# Altium schematic symbol library JL_SCH.SchLib: 1185 symbols (part 5 of 6)
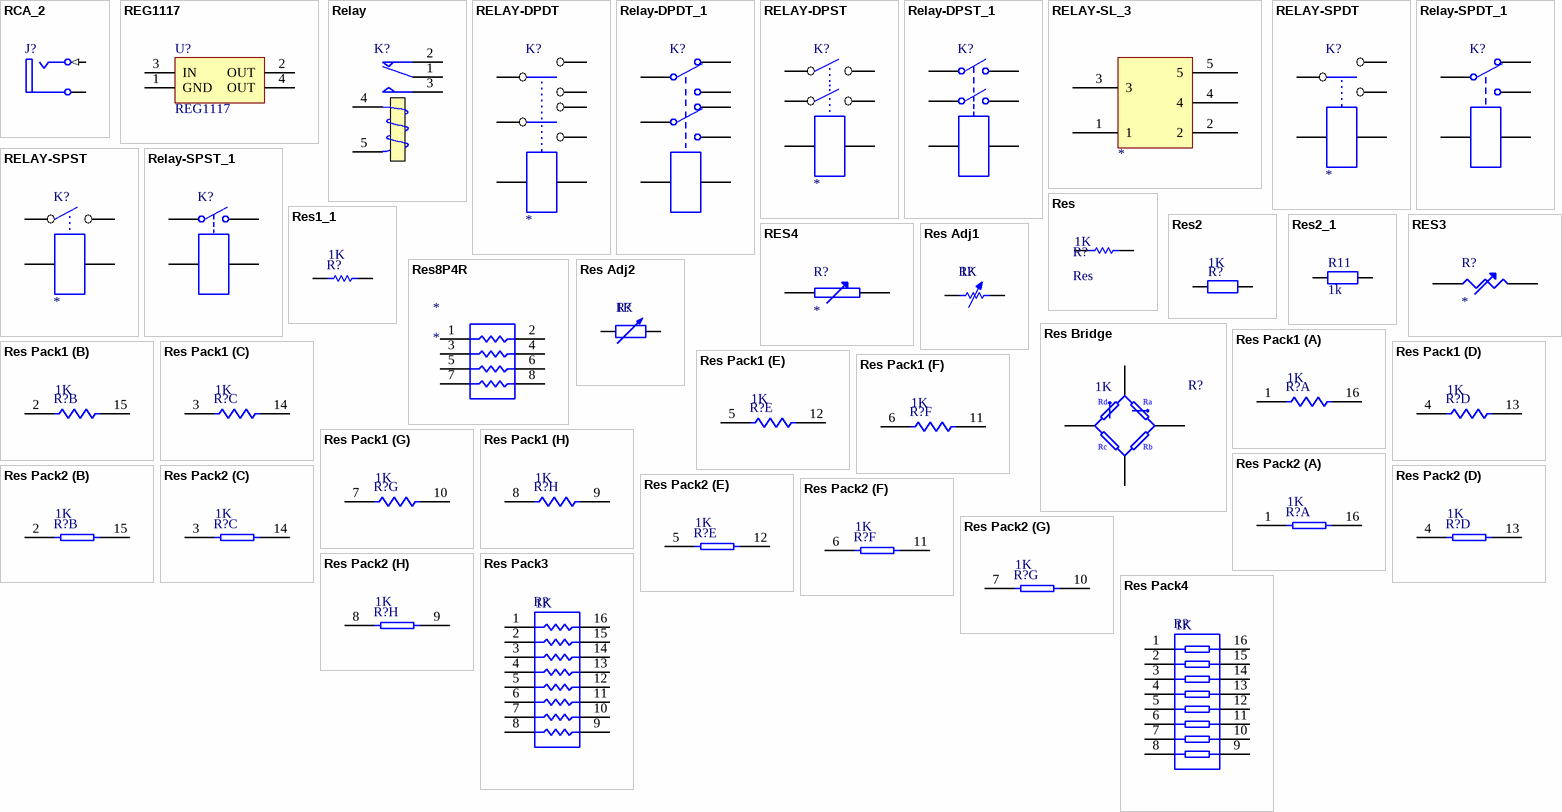
[diagram p42: symbols RCA_2 to Res Pack4]

## Res
designator R?  value 1K
贴片电阻; Published: 8-Jun-2000; LatestRevisionDate: 17-Jul-2002; LatestRevisionNote: Re-released for DXP Platform.; PackageReference: AXIAL-0.3; Publisher: Altium Limited
footprint R2012 (Chip Resistor, 2-Leads, Body 2.0x1.2mm, IPC Low Density)
pins: 1, 2

## Res1_1
designator R?  value 1K
Resistor; Published: 8-Jun-2000; LatestRevisionDate: 17-Jul-2002; LatestRevisionNote: Re-released for DXP Platform.; PackageReference: AXIAL-0.3; Publisher: Altium Limited
footprint AXIAL-0.3 (Axial Device, Thru-Hole; 2 Leads; 0.3 in Pin Spacing)
simulation model RESISTOR (Resistor)
signal-integrity model Res
pins: 1, 2

## Res2
designator R?, comment 1K
Resistor; Published: 8-Jun-2000; LatestRevisionDate: 17-Jul-2002; LatestRevisionNote: Re-released for DXP Platform.; PackageReference: AXIAL-0.4; Publisher: Altium Limited; Value: 1K
footprint 0805R
simulation model RESISTOR (Resistor)
signal-integrity model Res
3D model R0805 (PCB3D Model)
footprint 0603R
footprint 1206R
pins: 1, 2

## Res2_1
designator R11, comment 1k
Resistor; Published: 8-Jun-2000; LatestRevisionDate: 17-Jul-2002; LatestRevisionNote: Re-released for DXP Platform.; PackageReference: AXIAL-0.4; Publisher: Altium Limited; Value: 1k
footprint 0603 (Chip Inductor; Body 1.6 x 0.8 mm (LxW typ))
simulation model RESISTOR (Resistor)
signal-integrity model Res
pins: 1, 2

## RES3
designator R?
pins: 1, 2

## RES4
designator R?
pins: 1, 2

## Res8P4R
designator *
footprint 8P4R-B-SMD
pins: 1, 2, 3, 4, 5, 6, 7, 8

## Res Adj1
designator R?  value 1K
Variable Resistor; Set Position: 0.5; Published: 8-Jun-2000; LatestRevisionDate: 17-Jul-2002; LatestRevisionNote: Re-released for DXP Platform.; PackageReference: AXIAL-0.7; Publisher: Altium Limited
footprint AXIAL-0.7 (Axial Device, Thru-Hole; 2 Leads; 0.7 in Pin Spacing)
simulation model VRES (Variable Resistor)
signal-integrity model Res Adj
pins: 1, 2

## Res Adj2
designator R?  value 1K
Variable Resistor; Set Position: 0.5; Published: 8-Jun-2000; LatestRevisionDate: 17-Jul-2002; LatestRevisionNote: Re-released for DXP Platform.; PackageReference: AXIAL-0.6; Publisher: Altium Limited
footprint AXIAL-0.6 (Axial Device, Thru-Hole; 2 Leads; 0.6 in Pin Spacing)
simulation model VRES (Variable Resistor)
signal-integrity model Res Adj
pins: 1, 2

## Res Bridge
designator R?  value 1K
Resistor Bridge; Published: 24-Mar-1999; LatestRevisionDate: 17-Jul-2002; LatestRevisionNote: Re-released for DXP Platform.; PackageReference: P04A; Publisher: Altium Limited
footprint SFM-T4/A4.1V (TO, Thru-Hole, Vertical, Heatsink Mounted; 4 In-Line Leads; Pitch 2.54 mm)
signal-integrity model Res Bridge
pins: 1, 2, 3, 4
text: Rd; Ra; Rc; Rb

## Res Pack1
designator R?  value 1K
Isolated Resistor Network - Parts; Sim Note: Enter the Resistance value into parameter field.; Published: 24-Mar-1999; LatestRevisionDate: 29-May-2009; LatestRevisionNote: IPC-7351 Footprint Added.; PackageReference: SOIC16; Publisher: Altium Limited; PackageDescription: 16-Pin Small Outline Integrated Circuit 1.27 mm Pitch; Code_JEDEC: MS-012-AC; Code_IPC: SOIC127P600-16
footprint SOIC127P600-16N (SOIC, 16-Leads, Body 9.9x3.9mm, Pitch 1.27mm, IPC Medium Density)
footprint SOIC127P600-16L (SOIC, 16-Leads, Body 9.9x3.9mm, Pitch 1.27mm, IPC High Density)
footprint SOIC127P600-16M (SOIC, 16-Leads, Body 9.9x3.9mm, Pitch 1.27mm, IPC Low Density)
simulation model RESISTOR (Resistor)
signal-integrity model Res Pack
part A pins: 1, 16
part B pins: 2, 15
part C pins: 3, 14
part D pins: 4, 13
part E pins: 5, 12
part F pins: 6, 11
part G pins: 7, 10
part H pins: 8, 9

## Res Pack2
designator R?  value 1K
Isolated Resistor Network - Parts; Sim Note: Enter the Resistance value into parameter field.; Published: 24-Mar-1999; LatestRevisionDate: 17-Jul-2002; LatestRevisionNote: Re-released for DXP Platform.; PackageReference: DIP-16; Publisher: Altium Limited; Code_JEDEC: MO-001-AC
footprint DIP-16 (DIP; 16 Leads; Row Spacing 7.62 mm; Pitch 2.54 mm)
simulation model RESISTOR (Resistor)
signal-integrity model Res Pack
part A pins: 1, 16
part B pins: 2, 15
part C pins: 3, 14
part D pins: 4, 13
part E pins: 5, 12
part F pins: 6, 11
part G pins: 7, 10
part H pins: 8, 9

## Res Pack3
designator R?  value 1K
Isolated Resistor Network; Published: 24-Mar-1999; LatestRevisionDate: 29-May-2009; LatestRevisionNote: IPC-7351 Footprint Added.; PackageReference: SO-16; Publisher: Altium Limited; PackageDescription: 16-Pin Small Outline Integrated Circuit 1.27 mm Pitch; Code_JEDEC: MS-012-AC; Code_IPC: SOIC127P600-16
footprint SOIC127P600-16N (SOIC, 16-Leads, Body 9.9x3.9mm, Pitch 1.27mm, IPC Medium Density)
footprint SOIC127P600-16L (SOIC, 16-Leads, Body 9.9x3.9mm, Pitch 1.27mm, IPC High Density)
footprint SOIC127P600-16M (SOIC, 16-Leads, Body 9.9x3.9mm, Pitch 1.27mm, IPC Low Density)
simulation model respack_8 (Spice Subcircuit)
pins: 1, 2, 3, 4, 5, 6, 7, 8, 9, 10, 11, 12, 13, 14, 15, 16

## Res Pack4
designator R?  value 1K
Isolated Resistor Network; Published: 24-Mar-1999; LatestRevisionDate: 29-May-2009; LatestRevisionNote: IPC-7351 Footprint Added.; PackageVersion: Oct-2003; PackageReference: SSOP16; Publisher: Altium Limited; PackageDescription: 16-Pin Plastic Small Outline Package 0.65 mm Pitch; Code_JEDEC: MO-150-AC; Code_IPC: SOP65P780-16
footprint SOP65P780-16N (SOP, 16-Leads, Body 6.2x5.3mm, Pitch 0.65mm, IPC Medium Density)
footprint SOP65P780-16L (SOP, 16-Leads, Body 6.2x5.3mm, Pitch 0.65mm, IPC High Density)
footprint SOP65P780-16M (SOP, 16-Leads, Body 6.2x5.3mm, Pitch 0.65mm, IPC Low Density)
simulation model respack_8 (Spice Subcircuit)
pins: 1, 2, 3, 4, 5, 6, 7, 8, 9, 10, 11, 12, 13, 14, 15, 16

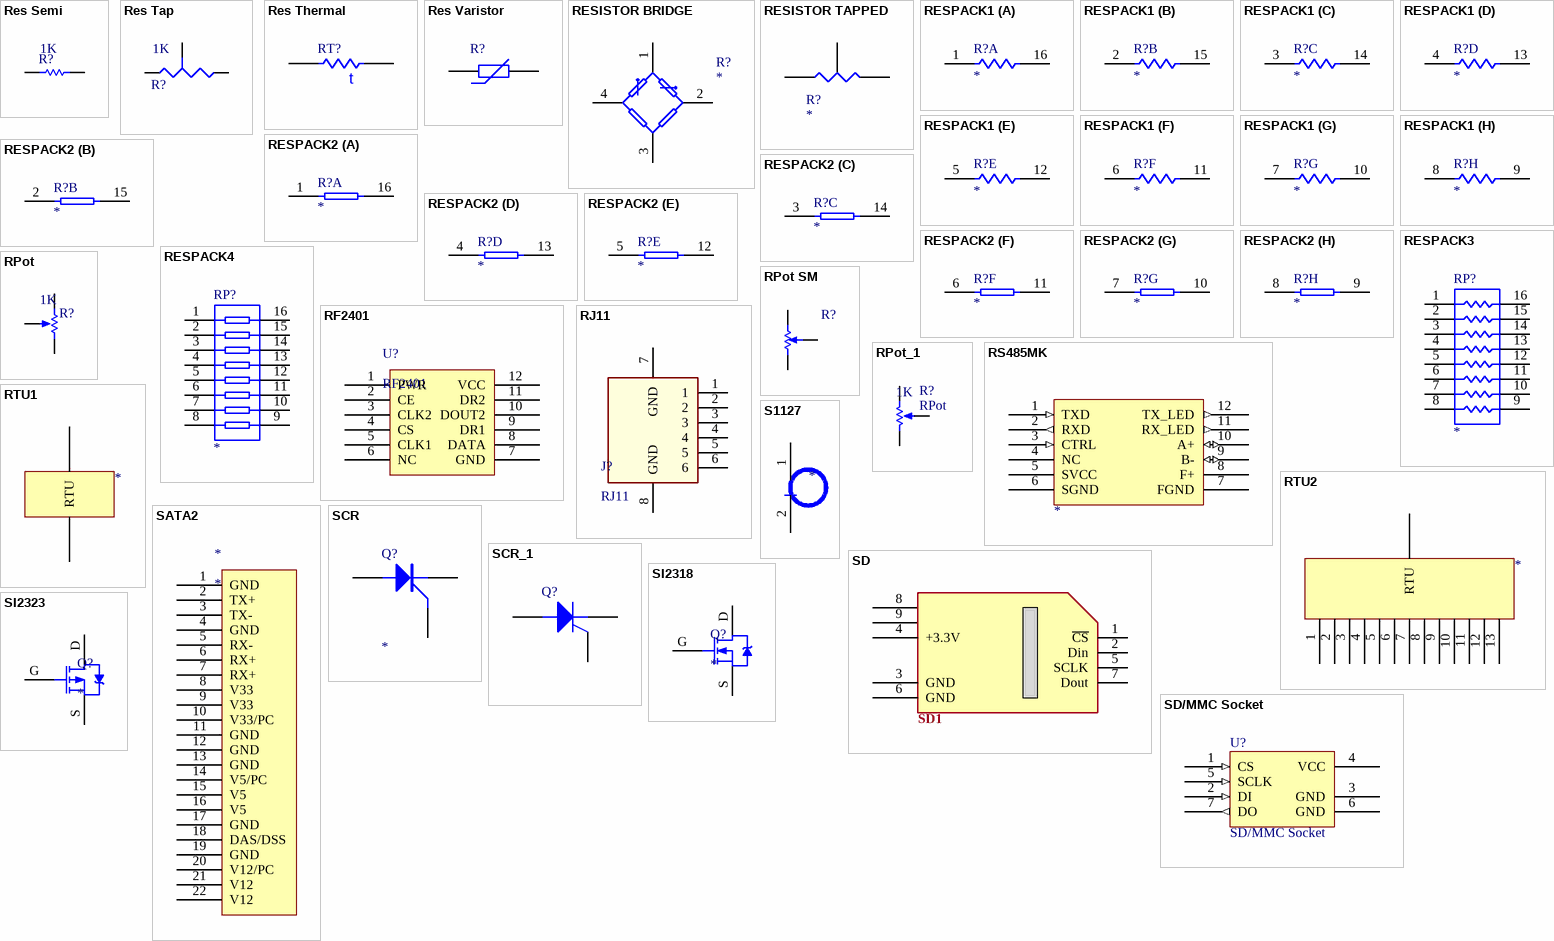
[diagram p28: symbols Res Semi to SI2323]

## Res Semi
designator R?  value 1K
Semiconductor Resistor; Published: 8-Jun-2000; LatestRevisionDate: 17-Jul-2002; LatestRevisionNote: Re-released for DXP Platform.; PackageReference: AXIAL-0.5; Publisher: Altium Limited
footprint AXIAL-0.5 (Axial Device, Thru-Hole; 2 Leads; 0.5 in Pin Spacing)
footprint RESC1005L (Chip Resistor, Body 1.1x0.5mm, IPC High Density)
footprint RESC1608L (Chip Resistor, Body 1.6x0.8mm, IPC High Density)
footprint RESC2012L (Chip Resistor, Body 2.0x1.3mm, IPC High Density)
footprint RESC3216L (Chip Resistor, Body 3.1x1.6mm, IPC High Density)
simulation model RES (Semiconductor Resistor)
signal-integrity model Res Semi
pins: 1, 2

## Res Tap
designator R?  value 1K
Tapped Resistor; Sim Note: Enter the Resistance value and the set point into parameter fields.; Set Position: 0.5; Published: 24-Mar-1999; LatestRevisionDate: 17-Jul-2002; LatestRevisionNote: Re-released for DXP Platform.; PackageReference: VR3; Publisher: Altium Limited
footprint VR3 (Variable Resistor, Thru-Hole; 3 Leads)
simulation model POT (Potentiometer)
signal-integrity model Res Tap
pins: 1 A, 2 B, 3 TAP

## Res Thermal
designator RT?
Thermistor; Published: 24-Mar-1999; LatestRevisionDate: 29-May-2009; LatestRevisionNote: IPC-7351 Footprint Added.; PackageVersion: Mar-2003; PackageReference: 6-0805; Publisher: Altium Limited; PackageDescription: Chip Resistor 0805 Case Size; Code_IPC: RESC2012
footprint RESC2012N (Chip Resistor, Body 2.0x1.2mm, IPC Medium Density)
footprint RESC2012L (Chip Resistor, Body 2.0x1.2mm, IPC High Density)
footprint RESC2012M (Chip Resistor, Body 2.0x1.2mm, IPC Low Density)
pins: 1, 2
text: t

## Res Varistor
designator R?
Varistor (Voltage-Sensitive Resistor); Published: 24-Mar-1999; LatestRevisionDate: 29-May-2009; LatestRevisionNote: IPC-7351 Footprint Added.; PackageVersion: Mar-2003; PackageReference: 6-0805; Publisher: Altium Limited; PackageDescription: Chip Resistor 0805 Case Size; Code_IPC: RESC2012
footprint RESC2012N (Chip Resistor, Body 2.0x1.2mm, IPC Medium Density)
footprint RESC2012L (Chip Resistor, Body 2.0x1.2mm, IPC High Density)
footprint RESC2012M (Chip Resistor, Body 2.0x1.2mm, IPC Low Density)
pins: 1, 2

## RESISTOR BRIDGE
designator R?
Resistor Bridge
pins: 1, 2, 3, 4

## RESISTOR TAPPED
designator R?
pins: 1 A, 2 B, 3 TAP

## RESPACK1
designator R?
footprint DIP-16
part A pins: 1, 16
part B pins: 2, 15
part C pins: 3, 14
part D pins: 4, 13
part E pins: 5, 12
part F pins: 6, 11
part G pins: 7, 10
part H pins: 8, 9

## RESPACK2
designator R?
footprint DIP-16
part A pins: 1, 16
part B pins: 2, 15
part C pins: 3, 14
part D pins: 4, 13
part E pins: 5, 12
part F pins: 6, 11
part G pins: 7, 10
part H pins: 8, 9

## RESPACK3
designator RP?
footprint DIP-16
pins: 1, 2, 3, 4, 5, 6, 7, 8, 9, 10, 11, 12, 13, 14, 15, 16

## RESPACK4
designator RP?
footprint DIP-16
pins: 1, 2, 3, 4, 5, 6, 7, 8, 9, 10, 11, 12, 13, 14, 15, 16

## RF2401
designator U?
footprint RF2401
pins: 1 PWR, 2 CE, 3 CLK2, 4 CS, 5 CLK1, 6 NC, 7 GND, 8 DATA, 9 DR1, 10 DOUT2, 11 DR2, 12 VCC

## RJ11
designator J?
footprint RJ11 (Footprint not found)
pins: 1, 2, 3, 4, 5, 6, 7 GND, 8 GND, 9, 10

## RPot
designator R?  value 1K
Potentiometer; Sim Note: Enter the Resistance value and the set point into parameter fields.; Set Position: 0.5; Published: 8-Jun-2000; LatestRevisionDate: 17-Jul-2002; LatestRevisionNote: Re-released for DXP Platform.; PackageReference: VR5; Publisher: Altium Limited
footprint VR5 (Variable Resistor, Thru-Hole; 3 Leads)
simulation model POT (Potentiometer)
pins: 1 TOP, 2 BOT, 3 TAP
1 alternate drawing of the same symbol

## RPot SM
designator R?
Square Trimming Potentiometer; Published: 17-Dec-2003; DatasheetVersion: Oct-2003; PackageReference: POT4MM-2; Publisher: Altium Limited; ComponentLink1Description: Manufacturer Link; ComponentLink1URL: http://bourns.com/2/search.html
footprint POT4MM-2 (Square Trimming Potentiometer)
pins: CCW -, CW +, W
1 alternate drawing of the same symbol

## RPot_1
designator R?, comment RPot  value 1K
电位器; Sim Note: Enter the Resistance value and the set point into parameter fields.; Set Position: 0.5; Published: 8-Jun-2000; LatestRevisionDate: 17-Jul-2002; LatestRevisionNote: Re-released for DXP Platform.; PackageReference: VR5; Publisher: Altium Limited
footprint RP1
pins: 1 TOP, 2 BOT, 3 TAP
1 alternate drawing of the same symbol

## RS485MK
designator ?
pins: 1 TXD (in), 2 RXD (out), 3 CTRL (in), 4 NC, 5 SVCC (power), 6 SGND (power), 7 FGND (power), 8 F+ (power), 9 B- (io), 10 A+ (io), 11 RX_LED (out), 12 TX_LED (out)

## RTU1
designator ?
pins: ?1 RTU, ?2

## RTU2
designator ?
pins: 1, 2, 3, 4, 5, 6, 7, 8, 9, 10, 11, 12, 13, ?1 RTU

## S1127
designator ?
pins: 1 A, 2 K

## SATA2
designator *
pins: 1 GND, 2 TX+, 3 TX-, 4 GND, 5 RX-, 6 RX+, 7 RX+, 8 V33, 9 V33, 10 V33/PC, 11 GND, 12 GND, 13 GND, 14 V5/PC, 15 V5, 16 V5, 17 GND, 18 DAS/DSS, 19 GND, 20 V12/PC, 21 V12, 22 V12

## SCR
designator Q?
pins: 1 A, 2 K, 3 G

## SCR_1
designator Q?
Silicon Controlled Rectifier; Published: 8-Jun-2000; LatestRevisionDate: 17-Jul-2002; LatestRevisionNote: Re-released for DXP Platform.; PackageReference: TO-220-AB; Publisher: Altium Limited; Code_JEDEC: TO-220-AB
footprint SFM-T3/E10.7V (TO, Thru-Hole, Vertical, Heatsink Mounted; 3 In-Line Leads; Pitch 2.54 mm)
simulation model SCR (Spice Subcircuit)
pins: 1 A, 2 G, 3 K

## SD
designator SD1  (value not drawn)
footprint SD-A
pins: 1 ~{CS}, 2 Din, 3 GND, 4 +3.3V, 5 SCLK, 6 GND, 7 Dout, 8, 9

## SD/MMC Socket
designator U?
footprint SDPCB
pins: 1 CS (in) "Chip Select (neg true)", 2 DI (in) "Data In", 3 GND (power) "Supply voltage ground", 4 VCC (power) "Supply voltage", 5 SCLK (in) "Clock", 6 GND (power) "Supply voltage ground", 7 DO (out) "Data Out"

## SI2318
designator Q?
footprint SIMOS
pins: D, G, S

## SI2323
designator Q?
footprint SIMOS
pins: D, G, S

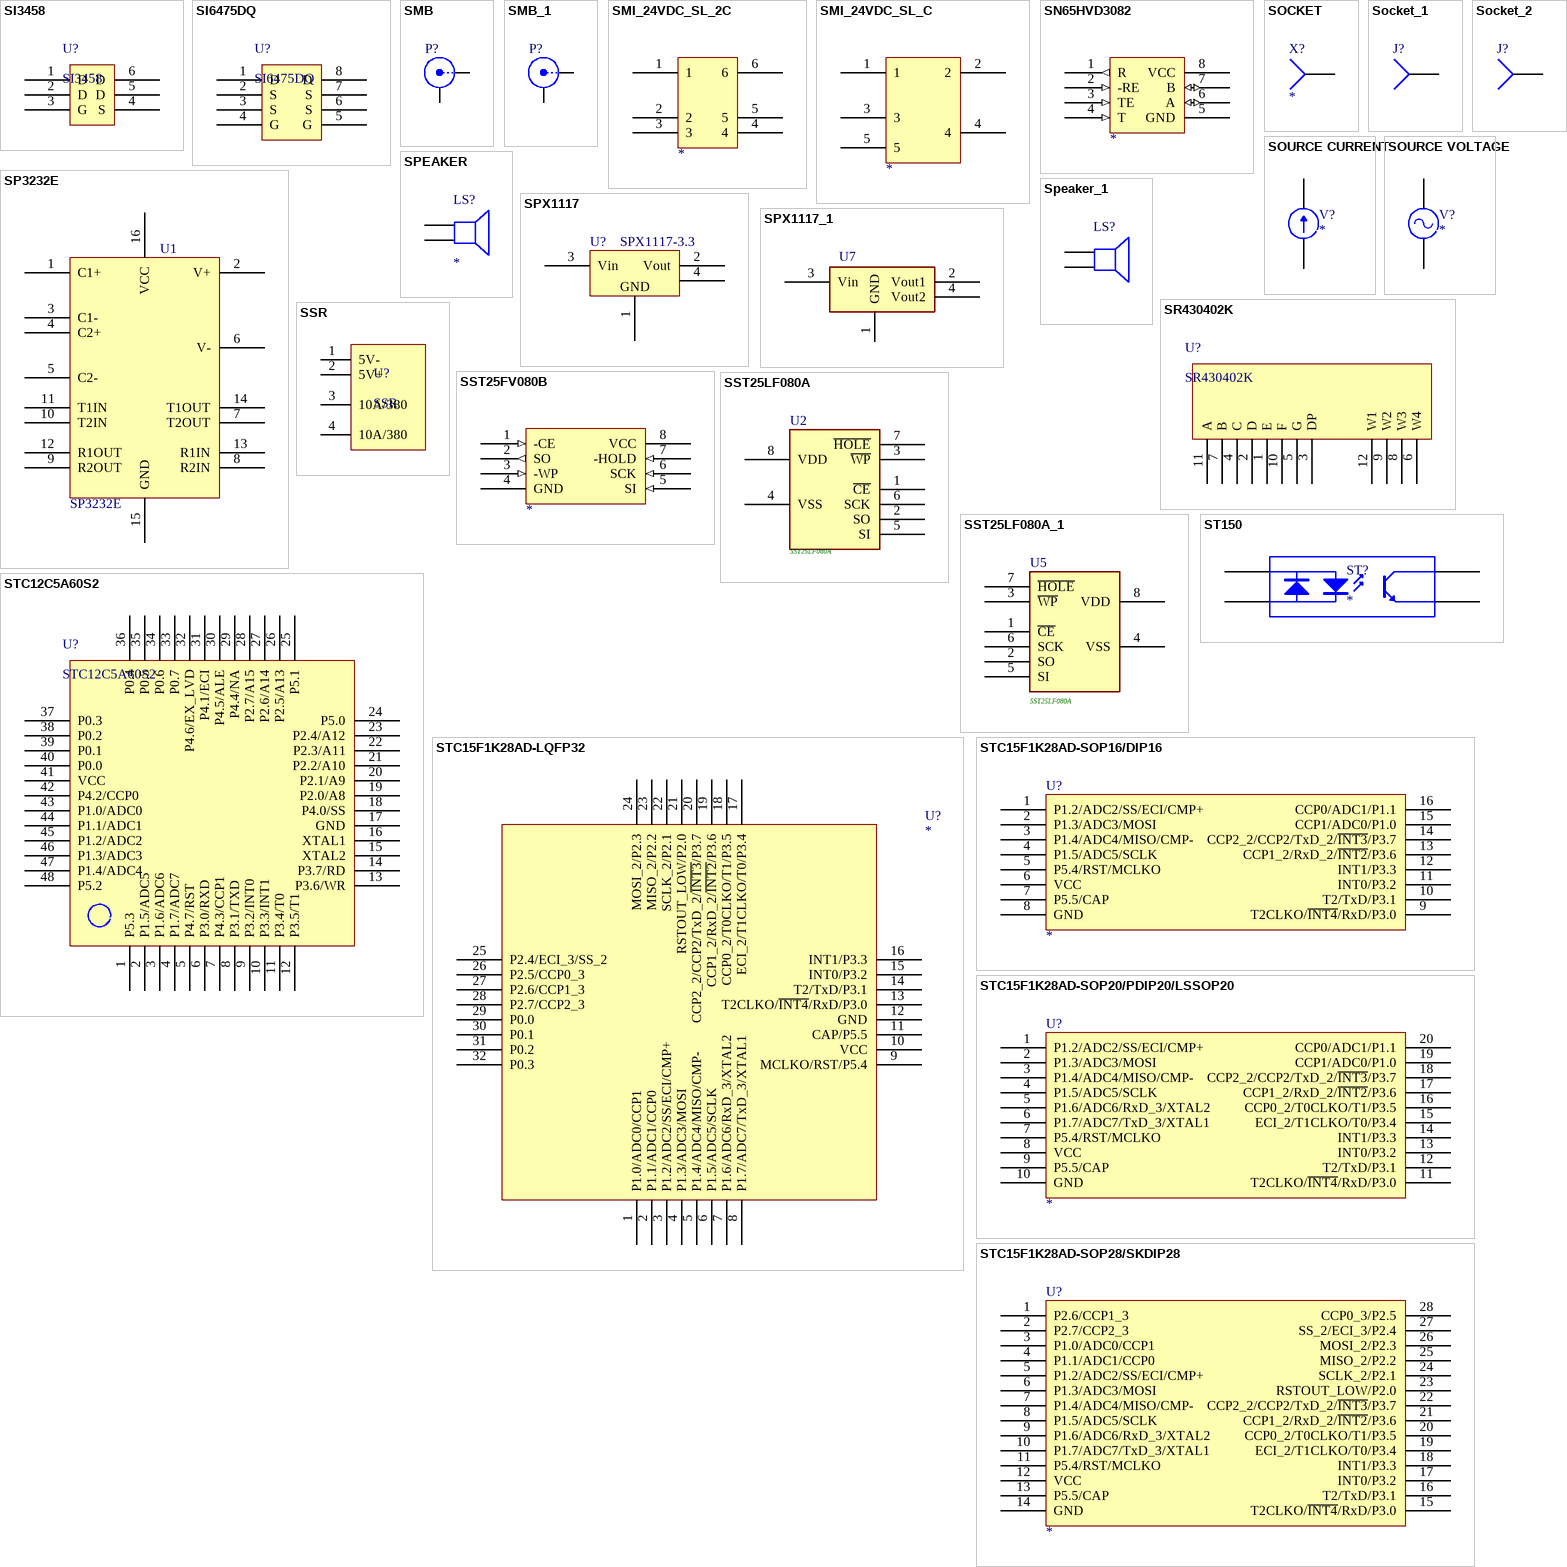
[diagram p29: symbols SI3458 to STC15F1K28AD-SOP28/SKDIP28]

## SI3458
designator U?
footprint TSOP-6 (Footprint not found)
pins: 1 D, 2 D, 3 G, 4 S, 5 D, 6 D

## SI6475DQ
designator U?
footprint TSSOP-8
pins: 1 D, 2 S, 3 S, 4 G, 5 G, 6 S, 7 S, 8 D

## SMB
designator P?
SMB Straight Connector; LatestRevisionDate: 17-Jul-2002; LatestRevisionNote: Re-released for DXP Platform.; Publisher: Altium Limited
footprint SMB_V-RJ45 (Connector; SMB Straight)
signal-integrity model Connector
pins: 1 X, 2 Y

## SMB_1
designator P?
SMB Straight Connector; LatestRevisionDate: 17-Jul-2002; LatestRevisionNote: Re-released for DXP Platform.; Publisher: Altium Limited
footprint SMB_V-RJ45 (Connector; SMB Straight)
signal-integrity model Connector
pins: 1 X, 2 Y

## SMI_24VDC_SL_2C
designator ?
pins: 1, 2, 3, 4, 5, 6

## SMI_24VDC_SL_C
designator ?
pins: 1, 2, 3, 4, 5

## SN65HVD3082
designator ?
pins: 1 R (out), 2 -RE (in), 3 TE (in), 4 T (in), 5 GND (power), 6 A (io), 7 B (io), 8 VCC (power)

## SOCKET
designator X?
pins: 1

## Socket_1
designator J?
Socket; LatestRevisionDate: 17-Jul-2002; LatestRevisionNote: Re-released for DXP Platform.; Publisher: Altium Limited
footprint PIN1 (Connector; Socket)
signal-integrity model Connector
pins: 1

## Socket_2
designator J?
Socket; LatestRevisionDate: 17-Jul-2002; LatestRevisionNote: Re-released for DXP Platform.; Publisher: Altium Limited
footprint PIN1 (Connector; Socket)
signal-integrity model Connector
pins: 1

## SOURCE CURRENT
designator V?
pins: 1, 2

## SOURCE VOLTAGE
designator V?
pins: 1, 2

## SP3232E
designator U1
footprint SOP16
footprint 85021_SO-16(150MIL)
footprint SO-16
pins: 1 C1+, 2 V+, 3 C1-, 4 C2+, 5 C2-, 6 V-, 7 T2OUT, 8 R2IN, 9 R2OUT, 10 T2IN, 11 T1IN, 12 R1OUT, 13 R1IN, 14 T1OUT, 15 GND, 16 VCC
2 alternate drawings of the same symbol

## SPEAKER
designator LS?
pins: 1, 2

## Speaker_1
designator LS?
Loudspeaker; Published: 24-Mar-1999; LatestRevisionDate: 17-Jul-2002; LatestRevisionNote: Re-released for DXP Platform.; PackageReference: PIN2; Publisher: Altium Limited
footprint PIN2 (Loudspeaker; 2 Leads)
pins: 1, 2

## SPX1117
designator U?, comment SPX1117-3.3
footprint SOT223 (SOT-223/SC-73; 4 Leads; Body 6.7 x 7.3 mm, inc. leads (LxW max))
pins: 1, 2 Vout, 3 Vin, 4
text: GND

## SPX1117_1
designator U7, comment SPX1117  (value not drawn)
3.3  1.8  1.2; Manufacturer: Generic Components; Class: Power Management; SubClass: Voltage Regulator; Published: 1999
footprint SOT-223(M3)
pins: 1 GND, 2 Vout1, 3 Vin, 4 Vout2

## SR430402K
designator U?
footprint SR430402K (Footprint not found)
pins: 1 E, 2 D, 3 DP, 4 C, 5 G, 6 W4, 7 B, 8 W3, 9 W2, 10 F, 11 A, 12 W1

## SSR
designator U?
footprint SSR (Footprint not found)
pins: 1 5V-, 2 5V+, 3 10A/380, 4 10A/380

## SST25FV080B
designator ?
pins: 1 -CE (in), 2 SO (out), 3 -WP (in), 4 GND (power), 5 SI (in), 6 SCK (in), 7 -HOLD (in), 8 VCC (power)

## SST25LF080A
designator U2
footprint SOIC-8
pins: 1 ~{CE}, 2 SO, 3 ~{WP}, 4 VSS, 5 SI, 6 SCK, 7 ~{HOLE}, 8 VDD

## SST25LF080A_1
designator U5, comment SST25LF080A
footprint SOIC-8
pins: 1 ~{CE}, 2 SO, 3 ~{WP}, 4 VSS, 5 SI, 6 SCK, 7 ~{HOLE}, 8 VDD

## ST150
designator ST?
footprint ST150
pins: A 1, C 4, E 3, K 2

## STC12C5A60S2
designator U?
footprint qfp48
pins: 1 P5.3, 2 P1.5/ADC5, 3 P1.6/ADC6, 4 P1.7/ADC7, 5 P4.7/RST, 6 P3.0/RXD, 7 P4.3/CCP1, 8 P3.1/TXD, 9 P3.2/INT0, 10 P3.3/INT1, 11 P3.4/T0, 12 P3.5/T1, 13 P3.6/WR, 14 P3.7/RD, 15 XTAL2, 16 XTAL1, 17 GND, 18 P4.0/SS, 19 P2.0/A8, 20 P2.1/A9, 21 P2.2/A10, 22 P2.3/A11, 23 P2.4/A12, 24 P5.0, 25 P5.1, 26 P2.5/A13, 27 P2.6/A14, 28 P2.7/A15, 29 P4.4/NA, 30 P4.5/ALE, 31 P4.1/ECI, 32 P4.6/EX_LVD, 33 P0.7, 34 P0.6, 35 P0.5, 36 P0.4, 37 P0.3, 38 P0.2, 39 P0.1, 40 P0.0, 41 VCC, 42 P4.2/CCP0, 43 P1.0/ADC0, 44 P1.1/ADC1, 45 P1.2/ADC2, 46 P1.3/ADC3, 47 P1.4/ADC4, 48 P5.2

## STC15F1K28AD-LQFP32
designator U?
footprint LQFP-32
pins: 1 P1.0/ADC0/CCP1, 2 P1.1/ADC1/CCP0, 3 P1.2/ADC2/SS/ECI/CMP+, 4 P1.3/ADC3/MOSI, 5 P1.4/ADC4/MISO/CMP-, 6 P1.5/ADC5/SCLK, 7 P1.6/ADC6/RxD_3/XTAL2, 8 P1.7/ADC7/TxD_3/XTAL1, 9 MCLKO/RST/P5.4, 10 VCC (power), 11 CAP/P5.5, 12 GND (power), 13 T2CLKO/~{INT4}/RxD/P3.0, 14 T2/TxD/P3.1, 15 INT0/P3.2, 16 INT1/P3.3, 17 ECI_2/T1CLKO/T0/P3.4, 18 CCP0_2/T0CLKO/T1/P3.5, 19 CCP1_2/RxD_2/~{INT2}/P3.6, 20 CCP2_2/CCP2/TxD_2/~{INT3}/P3.7, 21 RSTOUT_LOW/P2.0, 22 SCLK_2/P2.1, 23 MISO_2/P2.2, 24 MOSI_2/P2.3, 25 P2.4/ECI_3/SS_2, 26 P2.5/CCP0_3, 27 P2.6/CCP1_3, 28 P2.7/CCP2_3, 29 P0.0, 30 P0.1, 31 P0.2, 32 P0.3

## STC15F1K28AD-SOP16/DIP16
designator U?
footprint SOP-16
footprint DIP-16
pins: 1 P1.2/ADC2/SS/ECI/CMP+, 2 P1.3/ADC3/MOSI, 3 P1.4/ADC4/MISO/CMP-, 4 P1.5/ADC5/SCLK, 5 P5.4/RST/MCLKO, 6 VCC (power), 7 P5.5/CAP, 8 GND (power), 9 T2CLKO/~{INT4}/RxD/P3.0, 10 T2/TxD/P3.1, 11 INT0/P3.2, 12 INT1/P3.3, 13 CCP1_2/RxD_2/~{INT2}/P3.6, 14 CCP2_2/CCP2/TxD_2/~{INT3}/P3.7, 15 CCP1/ADC0/P1.0, 16 CCP0/ADC1/P1.1

## STC15F1K28AD-SOP20/PDIP20/LSSOP20
designator U?
footprint SOP-20
footprint PDIP-20
footprint LSSOP-20
pins: 1 P1.2/ADC2/SS/ECI/CMP+, 2 P1.3/ADC3/MOSI, 3 P1.4/ADC4/MISO/CMP-, 4 P1.5/ADC5/SCLK, 5 P1.6/ADC6/RxD_3/XTAL2, 6 P1.7/ADC7/TxD_3/XTAL1, 7 P5.4/RST/MCLKO, 8 VCC (power), 9 P5.5/CAP, 10 GND (power), 11 T2CLKO/~{INT4}/RxD/P3.0, 12 T2/TxD/P3.1, 13 INT0/P3.2, 14 INT1/P3.3, 15 ECI_2/T1CLKO/T0/P3.4, 16 CCP0_2/T0CLKO/T1/P3.5, 17 CCP1_2/RxD_2/~{INT2}/P3.6, 18 CCP2_2/CCP2/TxD_2/~{INT3}/P3.7, 19 CCP1/ADC0/P1.0, 20 CCP0/ADC1/P1.1

## STC15F1K28AD-SOP28/SKDIP28
designator U?
footprint SOP-28
footprint SKDIP-28
pins: 1 P2.6/CCP1_3, 2 P2.7/CCP2_3, 3 P1.0/ADC0/CCP1, 4 P1.1/ADC1/CCP0, 5 P1.2/ADC2/SS/ECI/CMP+, 6 P1.3/ADC3/MOSI, 7 P1.4/ADC4/MISO/CMP-, 8 P1.5/ADC5/SCLK, 9 P1.6/ADC6/RxD_3/XTAL2, 10 P1.7/ADC7/TxD_3/XTAL1, 11 P5.4/RST/MCLKO, 12 VCC (power), 13 P5.5/CAP, 14 GND (power), 15 T2CLKO/~{INT4}/RxD/P3.0, 16 T2/TxD/P3.1, 17 INT0/P3.2, 18 INT1/P3.3, 19 ECI_2/T1CLKO/T0/P3.4, 20 CCP0_2/T0CLKO/T1/P3.5, 21 CCP1_2/RxD_2/~{INT2}/P3.6, 22 CCP2_2/CCP2/TxD_2/~{INT3}/P3.7, 23 RSTOUT_LOW/P2.0, 24 SCLK_2/P2.1, 25 MISO_2/P2.2, 26 MOSI_2/P2.3, 27 SS_2/ECI_3/P2.4, 28 CCP0_3/P2.5

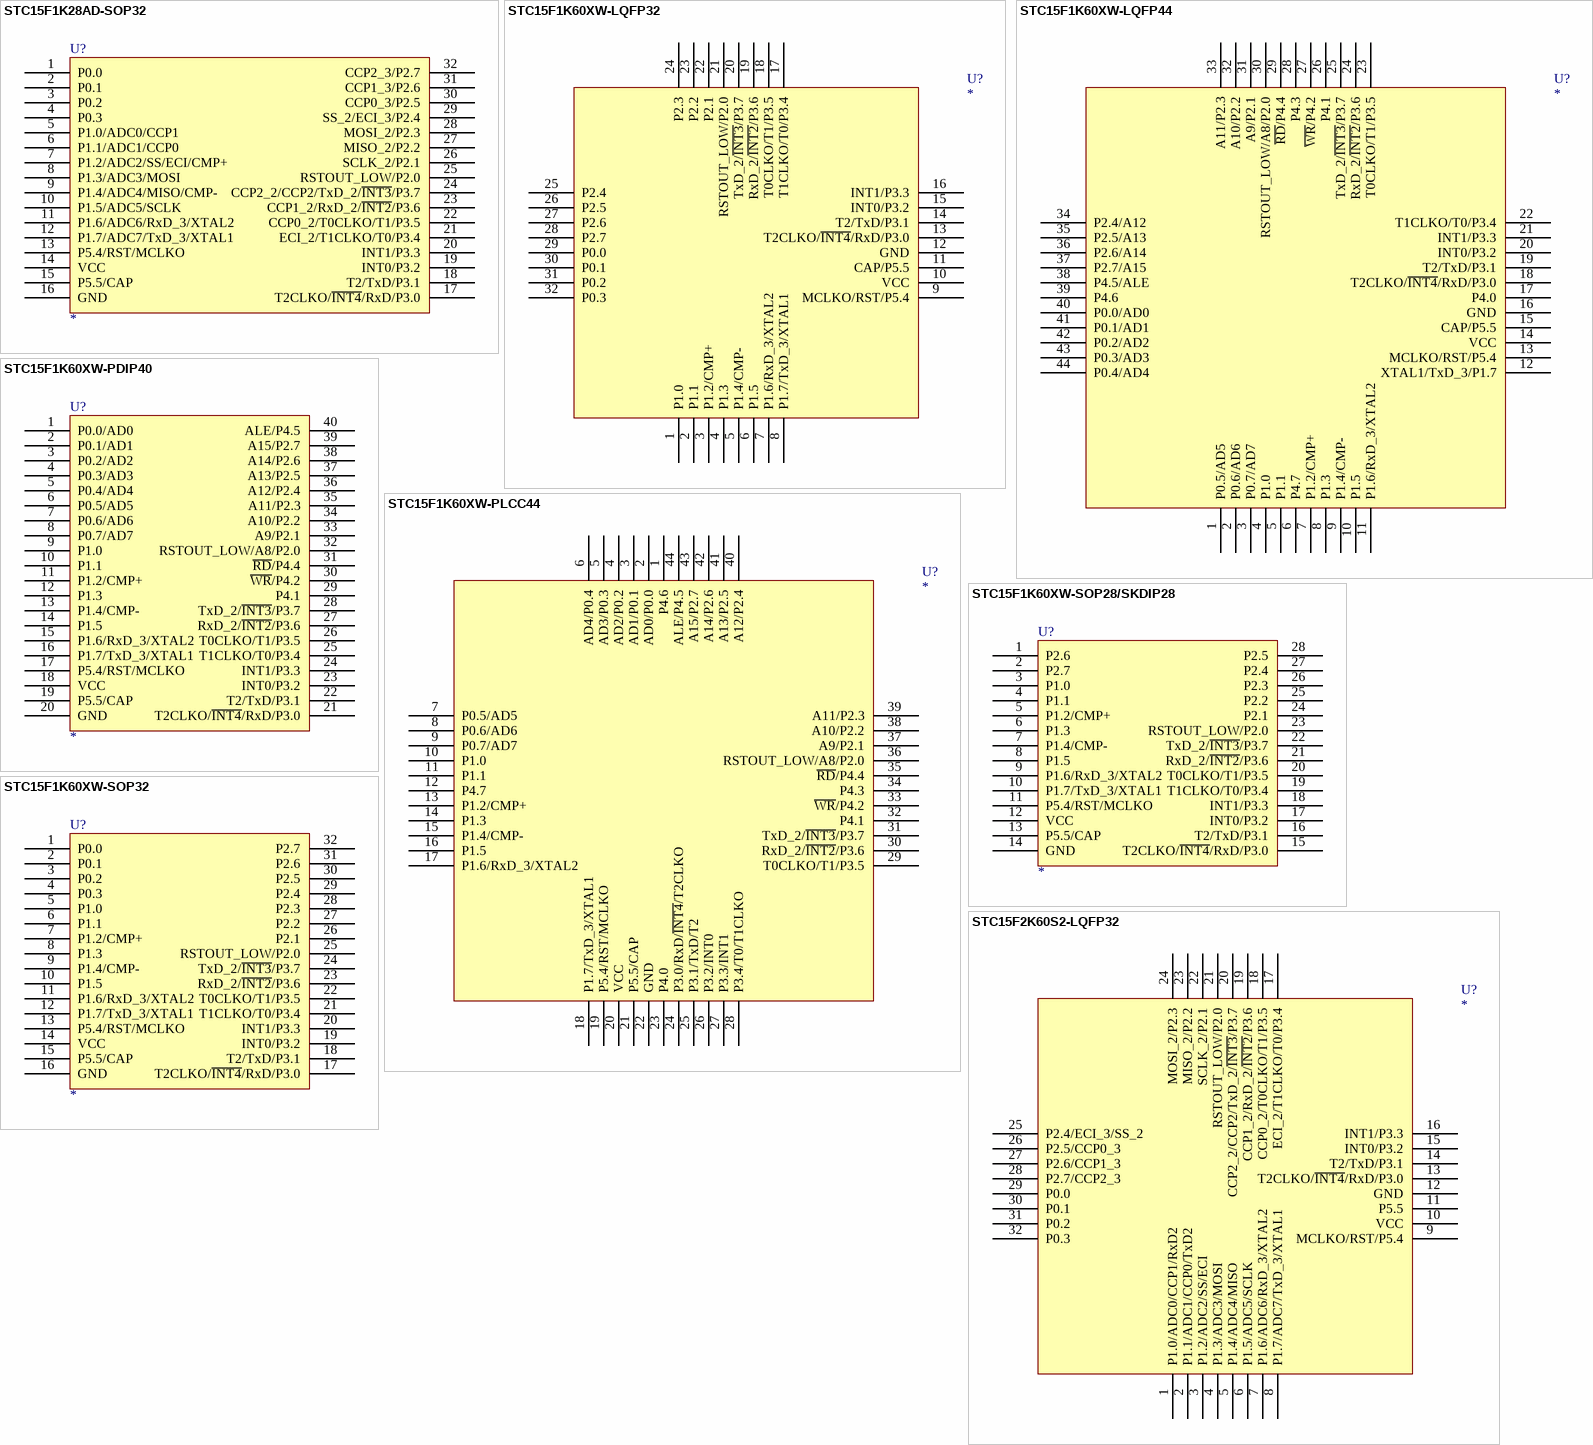
[diagram p30: symbols STC15F1K28AD-SOP32 to STC15F2K60S2-LQFP32]

## STC15F1K28AD-SOP32
designator U?
footprint SOP-32
pins: 1 P0.0, 2 P0.1, 3 P0.2, 4 P0.3, 5 P1.0/ADC0/CCP1, 6 P1.1/ADC1/CCP0, 7 P1.2/ADC2/SS/ECI/CMP+, 8 P1.3/ADC3/MOSI, 9 P1.4/ADC4/MISO/CMP-, 10 P1.5/ADC5/SCLK, 11 P1.6/ADC6/RxD_3/XTAL2, 12 P1.7/ADC7/TxD_3/XTAL1, 13 P5.4/RST/MCLKO, 14 VCC (power), 15 P5.5/CAP, 16 GND (power), 17 T2CLKO/~{INT4}/RxD/P3.0, 18 T2/TxD/P3.1, 19 INT0/P3.2, 20 INT1/P3.3, 21 ECI_2/T1CLKO/T0/P3.4, 22 CCP0_2/T0CLKO/T1/P3.5, 23 CCP1_2/RxD_2/~{INT2}/P3.6, 24 CCP2_2/CCP2/TxD_2/~{INT3}/P3.7, 25 RSTOUT_LOW/P2.0, 26 SCLK_2/P2.1, 27 MISO_2/P2.2, 28 MOSI_2/P2.3, 29 SS_2/ECI_3/P2.4, 30 CCP0_3/P2.5, 31 CCP1_3/P2.6, 32 CCP2_3/P2.7

## STC15F1K60XW-LQFP32
designator U?
footprint LQFP-32
pins: 1 P1.0, 2 P1.1, 3 P1.2/CMP+, 4 P1.3, 5 P1.4/CMP-, 6 P1.5, 7 P1.6/RxD_3/XTAL2, 8 P1.7/TxD_3/XTAL1, 9 MCLKO/RST/P5.4, 10 VCC (power), 11 CAP/P5.5, 12 GND (power), 13 T2CLKO/~{INT4}/RxD/P3.0, 14 T2/TxD/P3.1, 15 INT0/P3.2, 16 INT1/P3.3, 17 T1CLKO/T0/P3.4, 18 T0CLKO/T1/P3.5, 19 RxD_2/~{INT2}/P3.6, 20 TxD_2/~{INT3}/P3.7, 21 RSTOUT_LOW/P2.0, 22 P2.1, 23 P2.2, 24 P2.3, 25 P2.4, 26 P2.5, 27 P2.6, 28 P2.7, 29 P0.0, 30 P0.1, 31 P0.2, 32 P0.3

## STC15F1K60XW-LQFP44
designator U?
footprint LQFP-44
pins: 1 P0.5/AD5, 2 P0.6/AD6, 3 P0.7/AD7, 4 P1.0, 5 P1.1, 6 P4.7, 7 P1.2/CMP+, 8 P1.3, 9 P1.4/CMP-, 10 P1.5, 11 P1.6/RxD_3/XTAL2, 12 XTAL1/TxD_3/P1.7, 13 MCLKO/RST/P5.4, 14 VCC (power), 15 CAP/P5.5, 16 GND (power), 17 P4.0, 18 T2CLKO/~{INT4}/RxD/P3.0, 19 T2/TxD/P3.1, 20 INT0/P3.2, 21 INT1/P3.3, 22 T1CLKO/T0/P3.4, 23 T0CLKO/T1/P3.5, 24 RxD_2/~{INT2}/P3.6, 25 TxD_2/~{INT3}/P3.7, 26 P4.1, 27 ~{WR}/P4.2, 28 P4.3, 29 ~{RD}/P4.4, 30 RSTOUT_LOW/A8/P2.0, 31 A9/P2.1, 32 A10/P2.2, 33 A11/P2.3, 34 P2.4/A12, 35 P2.5/A13, 36 P2.6/A14, 37 P2.7/A15, 38 P4.5/ALE, 39 P4.6, 40 P0.0/AD0, 41 P0.1/AD1, 42 P0.2/AD2, 43 P0.3/AD3, 44 P0.4/AD4